# Altium footprint library LPEDT_Pulse_Project_PCB_Library.PcbLib: 34 footprints (part 2 of 3)
Each footprint in its own frame and in the unit in brackets; x right, y up, seen from the top. Pads: shape width x height; smd on the part's side, far side on the other; paste and mask are expansions set on the pad; w line width, h text height; cw(c..) or ccw(c..) is an arc to the next point about the centre after c.
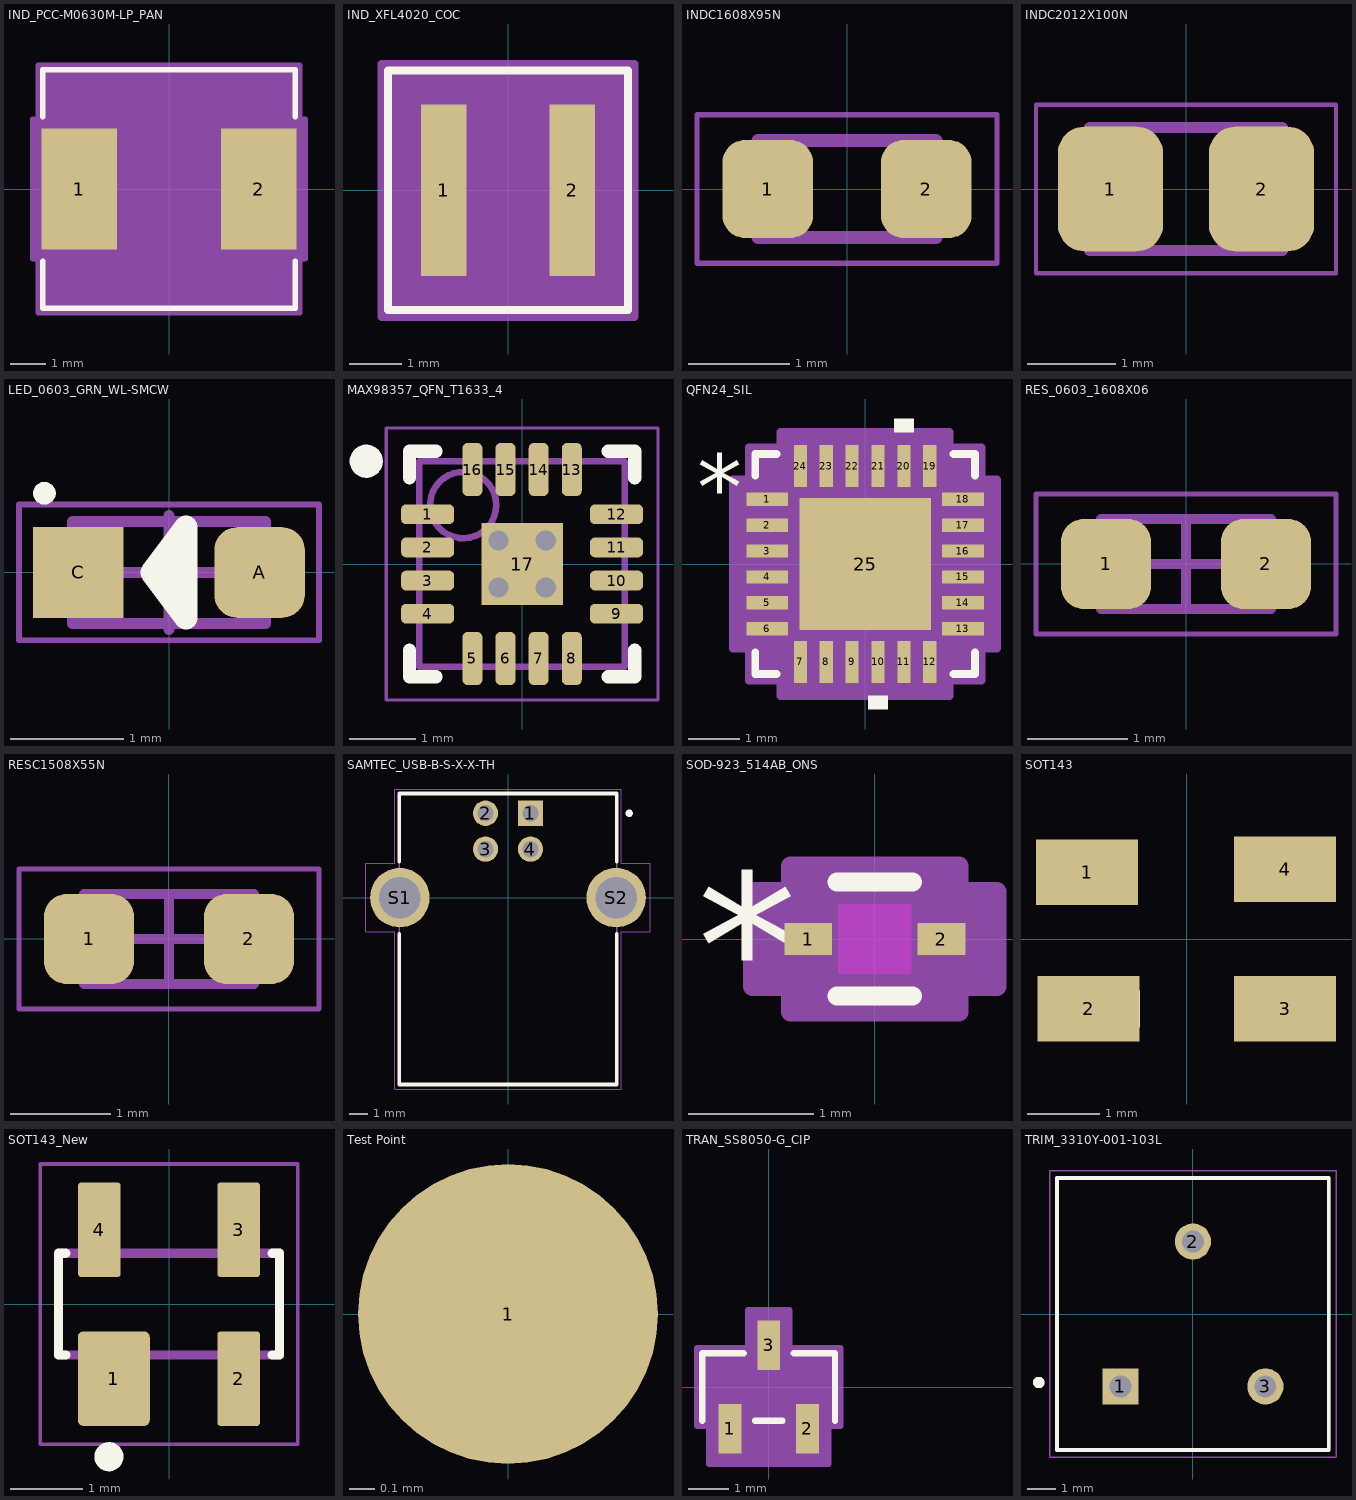
[diagram p1: the footprints below, top view; thin cyan lines are the x and y axes]

## IND_PCC-M0630M-LP_PAN [mil]
pads (2):
  rect 83x133 smd paste+0 mask+0: 1(-98.5,0) 2(98.5,0)
Top Overlay:
  lines w6: -139,-79.6 -139,-131 139,-131 139,-79.6 ; -139,79.6 -139,131 139,131 139,79.6
Mechanical 13:
  lines w1: -134,-63 -71,-126 ; -134,63 -71,126 ; -134,-126 134,-126 134,126 -134,126 -134,-126
Mechanical 15:
  region: -144,-76.5 -150,-76.5 -150,76.5 -144,76.5 -144,136 144,136 144,76.5 150,76.5 150,-76.5 144,-76.5 144,-136 -144,-136
  region: 134,-126 -134,-126 -134,126 134,126
  lines w6: -150,-76.5 -150,76.5 -144,76.5 -144,136 144,136 144,76.5 150,76.5 150,-76.5 144,-76.5 144,-136 -144,-136 -144,-76.5 -150,-76.5
3D body "IND_PCC-M0630M-LP_PAN.step": height 117.99, standoff 0, extent -134.02,-125.98 134.02,125.98

## IND_XFL4020_COC [mil]
pads (2):
  rect 34x128 smd paste+0 mask+0: 1(-48,0) 2(48,0)
Top Overlay:
  lines w6: -89.5,-89.5 -89.5,89.5 89.5,89.5 89.5,-89.5 -89.5,-89.5
Mechanical 13:
  circle w0: c-31,0 r3
  lines w0: -12,84.5 ccw(c0,84.5) 12,84.5
  lines w1: -84.5,-84.5 -84.5,84.5 84.5,84.5 84.5,-84.5 -84.5,-84.5
Mechanical 15:
  region: -94.5,-74 -94.5,74 -94.5,94.5 94.5,94.5 94.5,74 94.5,-74 94.5,-94.5 -94.5,-94.5
  lines w6: -94.5,-94.5 94.5,-94.5 94.5,-74 94.5,74 94.5,94.5 -94.5,94.5 -94.5,74 -94.5,-74 -94.5,-94.5
3D body "IND_XFL4020_COC.step": height 83.11, standoff 0, extent -84.49,-84.49 84.49,84.49

## INDC1608X95N [mm]
pads (2):
  rrect50% 0.9x0.97 smd: 1(-0.785,0) 2(0.785,0)
Mechanical 13:
  lines w0.127: -0.88,-0.48 0.88,-0.48 0.88,0.48 -0.88,0.48 -0.88,-0.48
Mechanical 15:
  lines w0.05: -1.485,-0.735 1.485,-0.735 1.485,0.735 -1.485,0.735 -1.485,-0.735
3D body "step_temp.STEP": height 0.95, standoff 0, extent -0.8,-0.4 0.8,0.4

## INDC2012X100N [mm]
pads (2):
  rrect50% 1.2x1.42 smd: 1(-0.86,0) 2(0.86,0)
Mechanical 13:
  lines w0.127: -1.1,-0.7 1.1,-0.7 1.1,0.7 -1.1,0.7 -1.1,-0.7
Mechanical 15:
  lines w0.05: -1.708,-0.958 1.708,-0.958 1.708,0.958 -1.708,0.958 -1.708,-0.958
3D body "step_temp.STEP": height 1, standoff 0, extent -1,-0.6 1,0.6

## LED_0603_GRN_WL-SMCW [mm] "SODFL, 2-Leads, Body 0.80x1.80mm, IPC Medium Density"
height 0.8
pads (2):
  rrect50% 0.8x0.8 smd: A(0.8,0)
  rect 0.8x0.8 smd: C(-0.8,0)
Top Overlay:
  circle w0.1: c-1.1,0.7 r0.05
  lines w0.2: -0.15,0 0.05,0
  lines w0.205: -0.15,0 0.15,-0.4 0.15,0.4 -0.15,0
Mechanical 13:
  lines w0.1: -0.85,-0.45 -0.85,0.45 0.85,0.45 0.85,-0.45 -0.85,-0.45
  text ".Designator" at -0.723,-0.254 h0.5
Mechanical 15:
  lines w0.05: -1.325,-0.6 -1.325,0.6 1.325,0.6 1.325,-0.6 -1.325,-0.6
  lines w0.1: -0.5,0 0.5,0 ; 0,-0.5 0,0.5
3D body "LED_0603_WURTH_WL-SMCW_lens.step": height 0.71, standoff 0.31, extent -0.55,-0.4 0.55,0.4
3D body "LED_0603_WURTH_WL-SMCW_base.step": height 0.65, standoff 0.01, extent -0.8,-0.4 0.8,0.4

## MAX98357_QFN_T1633_4 [mm] "QFN, 16-Leads, Body 3.00x3.00mm, Pitch 0.50mm, Thermal Pad 1.83x1.83mm, IPC Medium Density"
height 0.7
pads (17):
  rrect50% 0.8x0.3 smd: 1(-1.425,0.75) 2(-1.425,0.25) 3(-1.425,-0.25) 4(-1.425,-0.75) 9(1.425,-0.75) 10(1.425,-0.25) 11(1.425,0.25) 12(1.425,0.75)
  rrect50% 0.3x0.8 smd: 5(-0.75,-1.425) 6(-0.25,-1.425) 7(0.25,-1.425) 8(0.75,-1.425) 13(0.75,1.425) 14(0.25,1.425) 15(-0.25,1.425) 16(-0.75,1.425)
  rect 1.23x1.23 smd: 17(0,0)
via -0.356,-0.356 diameter 0.508 hole 0.305
via 0.356,-0.356 diameter 0.508 hole 0.305
via 0.356,0.356 diameter 0.508 hole 0.305
via -0.356,0.356 diameter 0.508 hole 0.305
Top Overlay:
  circle w0.25: c-2.35,1.55 r0.125
  lines w0.2: -1.7,-1.3 -1.7,-1.7 -1.3,-1.7 ; -1.7,1.3 -1.7,1.7 -1.3,1.7 ; 1.3,-1.7 1.7,-1.7 1.7,-1.3 ; 1.3,1.7 1.7,1.7 1.7,1.3
Mechanical 13:
  circle w0.1: c-0.889,0.889 r0.5
  lines w0.1: -1.55,-1.55 -1.55,1.55 1.55,1.55 1.55,-1.55 -1.55,-1.55
  text ".Designator" at -1.302,-1.169 h0.4
Mechanical 15:
  lines w0.05: -2.05,-2.05 -2.05,2.05 2.05,2.05 2.05,-2.05 -2.05,-2.05
3D body: height 0.7, standoff 0, extent -1.55,-1.55 1.55,1.55

## QFN24_SIL [mm]
pads (25):
  rect 0.808x0.255 smd paste+0 mask+0: 1(-1.89,1.25) 2(-1.89,0.75) 3(-1.89,0.25) 4(-1.89,-0.25) 5(-1.89,-0.75) 6(-1.89,-1.25) 13(1.89,-1.25) 14(1.89,-0.75) 15(1.89,-0.25) 16(1.89,0.25) 17(1.89,0.75) 18(1.89,1.25)
  rect 0.255x0.808 smd paste+0 mask+0: 7(-1.25,-1.89) 8(-0.75,-1.89) 9(-0.25,-1.89) 10(0.25,-1.89) 11(0.75,-1.89) 12(1.25,-1.89) 19(1.25,1.89) 20(0.75,1.89) 21(0.25,1.89) 22(-0.25,1.89) 23(-0.75,1.89) 24(-1.25,1.89)
  rect 2.54x2.54 smd paste-1.27 mask+0: 25(0,0)
Top Overlay:
  region: 0.941,2.548 0.56,2.548 0.56,2.802 0.941,2.802
  region: 0.44,-2.548 0.059,-2.548 0.059,-2.802 0.44,-2.802
  lines w0.152: -2.121,-1.71 -2.121,-2.121 -1.71,-2.121 ; -2.121,1.71 -2.121,2.121 -1.71,2.121 ; 1.71,-2.121 2.121,-2.121 2.121,-1.71 ; 1.71,2.121 2.121,2.121 2.121,1.71
  text "*" at -3.246,0.865 h1.27
Top Paste:
  region: 1.17,-0.1 0.1,-0.1 0.1,-1.17 1.17,-1.17
  region: 1.17,1.17 0.1,1.17 0.1,0.1 1.17,0.1
  region: -0.1,-0.1 -1.17,-0.1 -1.17,-1.17 -0.1,-1.17
  region: -0.1,1.17 -1.17,1.17 -1.17,0.1 -0.1,0.1
Mechanical 13:
  lines w0.025: -1.994,0.724 -0.724,1.994 ; -1.994,-1.994 -1.994,1.994 1.994,1.994 1.994,-1.994 -1.994,-1.994 ; -1.994,-1.402 -1.994,-1.098 -1.994,-1.402 ; -1.994,-0.902 -1.994,-0.598 -1.994,-0.902 ; -1.994,-0.402 -1.994,-0.098 -1.994,-0.402 ; -1.994,0.098 -1.994,0.402 -1.994,0.098 ; -1.994,0.598 -1.994,0.902 -1.994,0.598 ; -1.994,1.098 -1.994,1.402 -1.994,1.098 ; -1.402,-1.994 -1.098,-1.994 -1.402,-1.994 ; -1.402,1.994 -1.098,1.994 -1.402,1.994 ; -0.902,-1.994 -0.598,-1.994 -0.902,-1.994 ; -0.902,1.994 -0.598,1.994 -0.902,1.994 ; -0.402,-1.994 -0.098,-1.994 -0.402,-1.994 ; -0.402,1.994 -0.098,1.994 -0.402,1.994 ; 0.098,-1.994 0.402,-1.994 0.098,-1.994 ; 0.098,1.994 0.402,1.994 0.098,1.994 ; 0.598,-1.994 0.902,-1.994 0.598,-1.994 ; 0.598,1.994 0.902,1.994 0.598,1.994 ; 1.098,-1.994 1.402,-1.994 1.098,-1.994 ; 1.098,1.994 1.402,1.994 1.098,1.994 ; 1.994,-1.402 1.994,-1.098 1.994,-1.402 ; 1.994,-0.902 1.994,-0.598 1.994,-0.902 ; 1.994,-0.402 1.994,-0.098 1.994,-0.402 ; 1.994,0.098 1.994,0.402 1.994,0.098 ; 1.994,0.598 1.994,0.902 1.994,0.598 ; 1.994,1.098 1.994,1.402 1.994,1.098
  text ".Designator" at -1.651,-1.524 h0.3
  text "*" at -1.803,0.865 h1.27
Mechanical 15:
  region: -1.631,-2.248 -2.248,-2.248 -2.248,-1.631 -2.548,-1.631 -2.548,1.631 -2.248,1.631 -2.248,2.248 -1.631,2.248 -1.631,2.548 1.631,2.548 1.631,2.248 2.248,2.248 2.248,1.631 2.548,1.631 2.548,-1.631 2.248,-1.631 2.248,-2.248 1.631,-2.248 1.631,-2.548 -1.631,-2.548
  lines w0.152: -2.548,-1.631 -2.548,1.631 -2.248,1.631 -2.248,2.248 -1.631,2.248 -1.631,2.548 1.631,2.548 1.631,2.248 2.248,2.248 2.248,1.631 2.548,1.631 2.548,-1.631 2.248,-1.631 2.248,-2.248 1.631,-2.248 1.631,-2.548 -1.631,-2.548 -1.631,-2.248 -2.248,-2.248 -2.248,-1.631 -2.548,-1.631
3D body "QFN24_SIL.step": height 0.81, standoff 0, extent -1.994,-1.994 1.994,1.994

## RES_0603_1608X06 [mm] "Chip Resistor, 2-Leads, Body 1.60x0.80mm, IPC Medium Density"
height 0.55
pads (2):
  rrect50% 0.9x0.9 smd: 1(-0.8,0) 2(0.8,0)
Mechanical 13:
  lines w0.1: -0.85,-0.45 -0.85,0.45 0.85,0.45 0.85,-0.45 -0.85,-0.45
  text ".Designator" at -0.635,-0.254 h0.4
Mechanical 15:
  lines w0.05: -1.5,-0.7 -1.5,0.7 1.5,0.7 1.5,-0.7 -1.5,-0.7
  lines w0.1: -0.45,0 0.45,0 ; 0,-0.45 0,0.45
3D body "0603_1608X05N.step": height 0.45, standoff 0, extent -0.775,-0.425 0.775,0.425

## RESC1508X55N [mm]
pads (2):
  rrect50% 0.9x0.9 smd: 1(-0.8,0) 2(0.8,0)
Mechanical 13:
  lines w0.1: -0.85,-0.45 0.85,-0.45 0.85,0.45 -0.85,0.45 -0.85,-0.45
  text ".Designator" at -0.635,-0.254 h0.4
Mechanical 15:
  lines w0.05: -1.5,-0.7 1.5,-0.7 1.5,0.7 -1.5,0.7 -1.5,-0.7
  lines w0.1: -0.45,0 0.45,0 ; 0,-0.45 0,0.45
3D body "0603_1608X05N.step": height 0.45, standoff 0, extent -0.775,-0.425 0.775,0.425

## SAMTEC_USB-B-S-X-X-TH [mm]
height 10.95
pads (6):
  rect 1.408x1.408 / inner round 1.408 / far side rect 1.408x1.408 hole 0.9: 1(1.25,4.7)
  round 1.408 hole 0.9: 2(-1.25,4.7) 3(-1.25,2.7) 4(1.25,2.7)
  round 3.316 hole 2.3: S1(-6.02,0) S2(6.02,0)
Top Overlay:
  circle w0.2: c6.75,4.7 r0.1
  lines w0.2: -6.05,-2.01 -6.05,-10.4 6.05,-10.4 6.05,-2.01 ; -6.05,2.01 -6.05,5.8 6.05,5.8 6.05,2.01
Mechanical 13:
  circle w0.2: c6.75,4.7 r0.1
  lines w0.1: -6.05,-10.4 -6.05,5.8 6.05,5.8 6.05,-10.4 -6.05,-10.4
Mechanical 15:
  lines w0.05: -7.93,-1.91 -7.93,1.91 -6.3,1.91 -6.3,6.05 6.3,6.05 6.3,1.91 7.93,1.91 7.93,-1.91 6.3,-1.91 6.3,-10.65 -6.3,-10.65 -6.3,-1.91 -7.93,-1.91

## SOD-923_514AB_ONS [mil]
pads (2):
  rect 15x10 smd paste+0 mask+0: 1(-21,0) 2(21,0)
Top Layer keep-out:
  region: -11.5,-11 -11.5,11 11.5,11 11.5,-11
Top Overlay:
  lines w6: -11.88,-18 11.88,-18 ; -11.88,18 11.88,18
  text "*" at -56,-25 h50
Keep-Out Layer:
  region: -11.5,-11 -11.5,11 11.5,11 11.5,-11
Mechanical 13:
  lines w1: -16.5,-6.5 -10,-13 ; -16.5,6.5 -10,13 ; -20.5,-5 -16.5,-5 -16.5,5 -20.5,5 -20.5,-5 ; -16.5,-13 -16.5,13 16.5,13 16.5,-13 -16.5,-13 ; 16.5,-5 20.5,-5 20.5,5 16.5,5 16.5,-5
  text "*" at -19,-25 h50
Mechanical 15:
  region: -26.5,-15 -38.5,-15 -38.5,15 -26.5,15 -26.5,23 26.5,23 26.5,15 38.5,15 38.5,-15 26.5,-15 26.5,-23 -26.5,-23
  lines w6: -38.5,-15 -26.5,-15 -26.5,-23 26.5,-23 26.5,-15 38.5,-15 38.5,15 26.5,15 26.5,23 -26.5,23 -26.5,15 -38.5,15 -38.5,-15
3D body "SOD-923_514AB_ONS.step": height 16.26, standoff 0, extent -20.51,-12.99 20.51,12.99

## SOT143 [mm]
pads (4):
  rect 1.4x0.9 smd paste-2 mask+0: 1(-1.372,0.914) 2(-1.35,-0.96) 3(1.35,-0.96) 4(1.35,0.96)
Top Overlay:
  region: -0.675,0.668 -1.302,0.668 -1.302,1.17 -0.675,1.17
  region: -0.65,-1.212 -1.277,-1.212 -1.277,-0.71 -0.65,-0.71
  region: 1.275,-1.212 0.651,-1.212 0.651,-0.71 1.275,-0.71
  region: 1.275,0.711 0.651,0.711 0.651,1.21 1.275,1.21
Top Paste:
  region: -0.65,-1.411 -2.051,-1.411 -2.051,-0.51 -0.65,-0.51
  region: 2.05,-1.41 0.65,-1.41 0.65,-0.51 2.05,-0.51
  region: 2.05,0.51 0.651,0.51 0.651,1.41 2.05,1.41
  region: -0.67,0.457 -2.073,0.457 -2.073,1.372 -0.67,1.372
Top Solder:
  region: -0.65,-1.412 -2.052,-1.412 -2.052,-0.51 -0.65,-0.51
  region: 2.05,-1.412 0.651,-1.412 0.651,-0.51 2.05,-0.51
  region: 2.05,0.51 0.65,0.51 0.65,1.41 2.05,1.41
  region: -0.671,0.483 -2.072,0.483 -2.072,1.372 -0.671,1.372
3D body "step_temp.STEP": height 1.22, standoff 0, extent -1.185,-1.46 1.185,1.46

## SOT143_New [mm]
pads (4):
  rrect15% 0.99x1.3 smd: 1(-0.76,-1.025)
  rrect15% 0.59x1.3 smd: 2(0.96,-1.025) 3(0.96,1.025) 4(-0.96,1.025)
Top Overlay:
  circle w0.2: c-0.827,-2.1 r0.1
  lines w0.127: -1.42,-0.7 -1.52,-0.7 -1.52,0.7 -1.42,0.7 ; 1.42,-0.7 1.52,-0.7 1.52,0.7 1.42,0.7
Mechanical 13:
  lines w0.127: -1.52,-0.7 1.52,-0.7 1.52,0.7 -1.52,0.7 -1.52,-0.7
Mechanical 15:
  lines w0.05: -1.77,-1.93 1.77,-1.93 1.77,1.93 -1.77,1.93 -1.77,-1.93
3D body "step_temp.STEP": height 1.22, standoff 0, extent -1.185,-1.46 1.185,1.46

## Test Point [mm]
pads (1):
  round 1.2 smd paste-2539.97: 1(0,0)

## TRAN_SS8050-G_CIP [mil]
pads (3):
  rect 22x48 smd paste+0 mask+0: 1(-37.4,-40.2) 2(37.4,-40.2) 3(0,40.2)
Top Overlay:
  lines w6: -64,-32.5 -64,32.5 -24.1,32.5 ; -13.3,-32.5 13.3,-32.5 ; 24.1,32.5 64,32.5 64,-32.5
Mechanical 13:
  lines w1: -59,-27.5 59,-27.5 59,27.5 -59,27.5 -59,-27.5 ; -47.4,-50.2 -47.4,-27.5 -27.4,-27.5 -27.4,-50.2 -47.4,-50.2 ; -10,27.5 10,27.5 10,50.2 -10,50.2 -10,27.5 ; 27.4,-50.2 27.4,-27.5 47.4,-27.5 47.4,-50.2 27.4,-50.2
Mechanical 15:
  region: -69,-37.5 -69,37.5 -20,37.5 -20,74.2 20,74.2 20,37.5 69,37.5 69,-37.5 57.4,-37.5 57.4,-74.2 -57.4,-74.2 -57.4,-37.5
  lines w6: -69,-37.5 -69,37.5 -20,37.5 -20,74.2 20,74.2 20,37.5 69,37.5 69,-37.5 57.4,-37.5 57.4,-74.2 -57.4,-74.2 -57.4,-37.5 -69,-37.5
3D body "TRAN_SS8050-G_CIP.step": height 41.1, standoff 0, extent -59.02,-50.2 59.02,50.2

## TRIM_3310Y-001-103L [mm]
pads (3):
  rect 1.268x1.268 / inner round 1.268 / far side rect 1.268x1.268 hole 0.76: 1(-2.54,-2.54)
  round 1.268 hole 0.76: 2(0,2.54) 3(2.54,-2.54)
Top Overlay:
  circle w0.2: c-5.4,-2.4 r0.1
  lines w0.127: -4.765,-4.765 4.765,-4.765 4.765,4.765 -4.765,4.765 -4.765,-4.765
Mechanical 13:
  circle w0.2: c-5.4,-2.4 r0.1
  lines w0.127: -4.765,-4.765 4.765,-4.765 4.765,4.765 -4.765,4.765 -4.765,-4.765
Mechanical 15:
  lines w0.05: -5.015,-5.015 5.015,-5.015 5.015,5.015 -5.015,5.015 -5.015,-5.015
3D body "step_temp.STEP": height 18.9, standoff -6.86, extent -4.765,-4.765 4.765,4.765